# Altium footprint library SOCKET_DIPSMD.PcbLib: 18 footprints (part 1 of 2)
Each footprint in its own frame and in the unit in brackets; x right, y up, seen from the top. Pads: shape width x height; smd on the part's side, far side on the other; paste and mask are expansions set on the pad; w line width, h text height; cw(c..) or ccw(c..) is an arc to the next point about the centre after c.
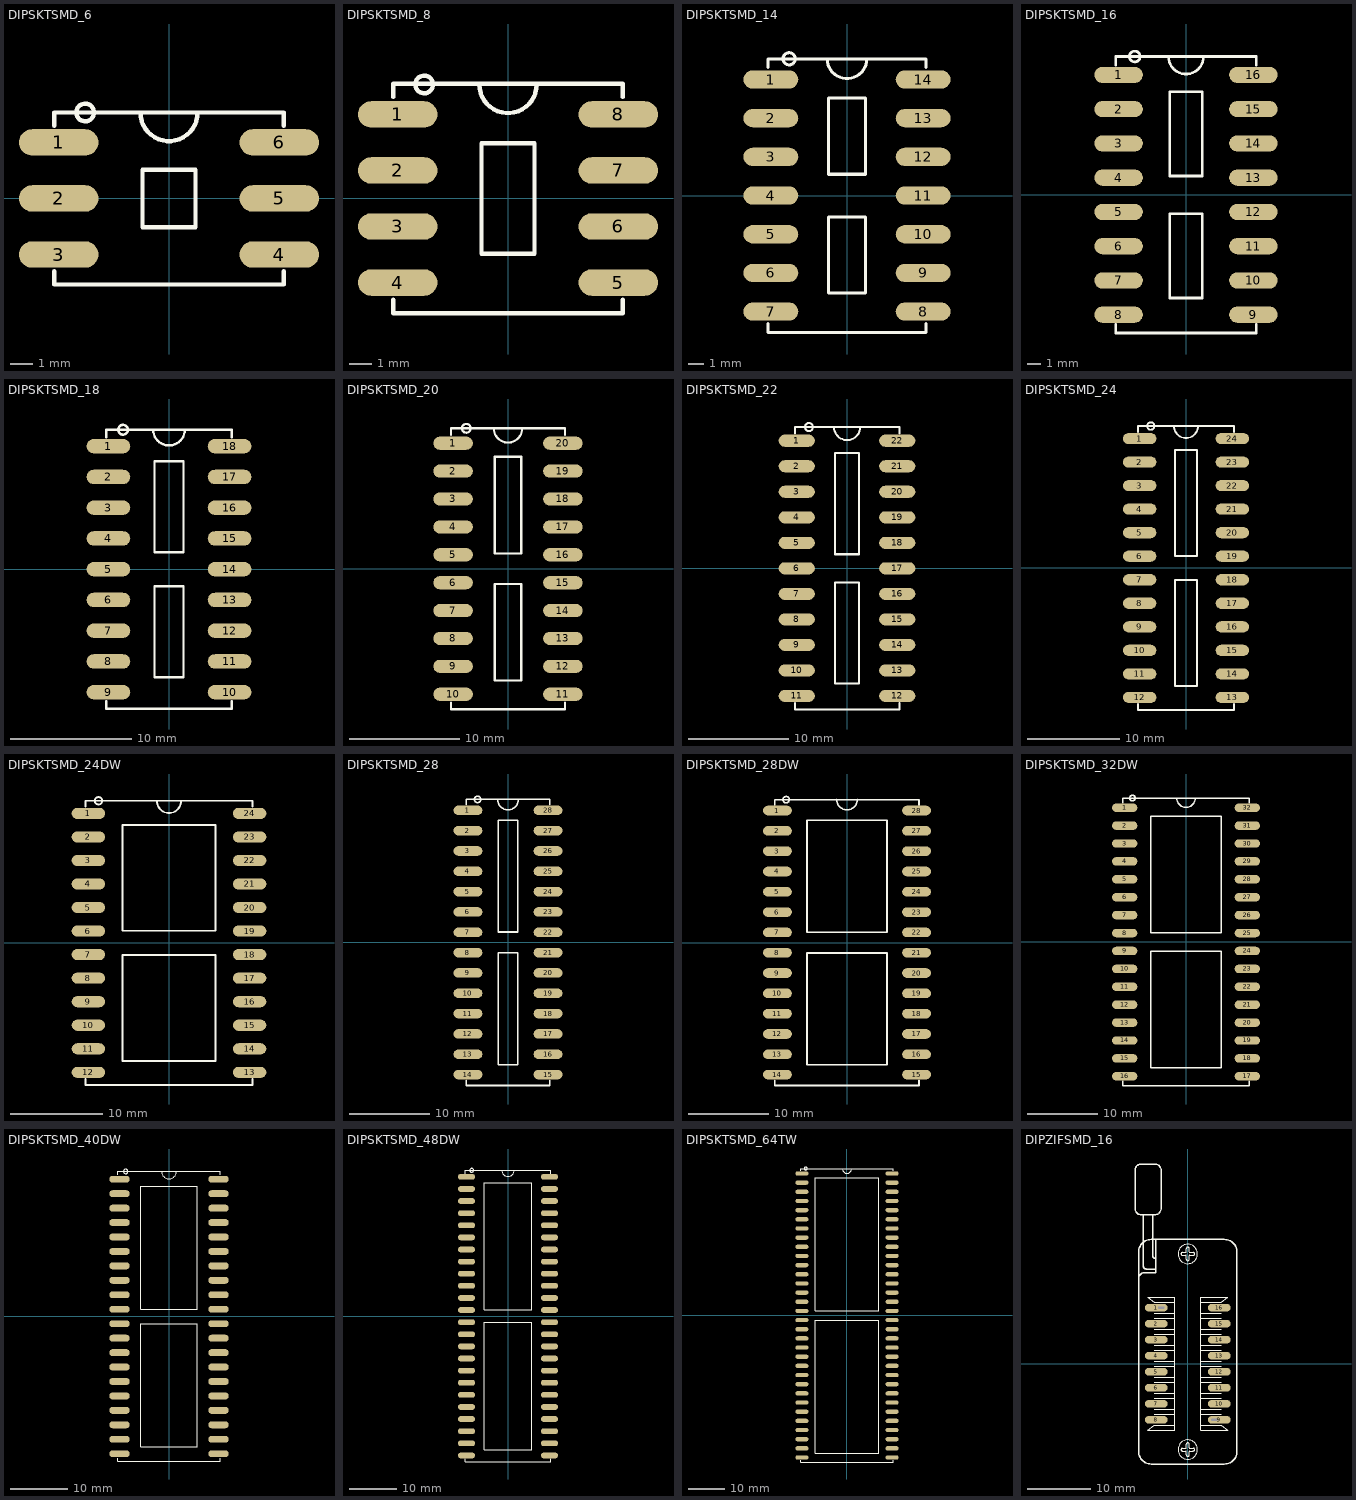
[diagram p0: the footprints below, top view; thin cyan lines are the x and y axes]

## DIPSKTSMD_6 [mm] "SOCKET DIP, pitch 2.54mm, 300mil Width"
pads (6):
  oval 3.6x1.2 smd: 1(-5,2.54) 2(-5,0) 3(-5,-2.54) 4(5,-2.54) 5(5,0) 6(5,2.54)
TopOverlay:
  circle w0.2: c-3.8,3.9 r0.4
  lines w0.2: -5.2,-3.3 -5.2,-3.9 5.2,-3.9 5.2,-3.3 ; -5.2,3.3 -5.2,3.9 5.2,3.9 5.2,3.3 ; -1.3,3.9 ccw(c0,3.9) 1.3,3.9 ; -1.2,-1.3 -1.2,1.3 1.2,1.3 1.2,-1.3 -1.2,-1.3
3D body "User Library-6pin 0_3inch 2_54mm IC DIP-SMD Gold Socket.step": height 5.7, standoff 0.02, extent -6.21,-3.8 6.21,3.82

## DIPSKTSMD_8 [mm] "SOCKET DIP, pitch 2.54mm, 300mil Width"
pads (8):
  oval 3.6x1.2 smd: 1(-5,3.81) 2(-5,1.27) 3(-5,-1.27) 4(-5,-3.81) 5(5,-3.81) 6(5,-1.27) 7(5,1.27) 8(5,3.81)
TopOverlay:
  circle w0.2: c-3.8,5.17 r0.4
  lines w0.2: -5.2,-4.6 -5.2,-5.2 5.2,-5.2 5.2,-4.6 ; -5.2,4.6 -5.2,5.2 5.2,5.2 5.2,4.6 ; -1.3,5.17 ccw(c0,5.17) 1.3,5.17 ; -1.2,-2.5 1.2,-2.5 1.2,2.5 -1.2,2.5 -1.2,-2.5
3D body "User Library-8pin 0_3inch 2_54mm IC DIP-SMD Gold Socket.step": height 5.7, standoff 0.02, extent -6.19,-5.08 6.23,5.08

## DIPSKTSMD_14 [mm] "SOCKET DIP, pitch 2.54mm, 300mil Width"
pads (14):
  oval 3.6x1.2 smd: 1(-5,7.62) 2(-5,5.08) 3(-5,2.54) 4(-5,0) 5(-5,-2.54) 6(-5,-5.08) 7(-5,-7.62) 8(5,-7.62) 9(5,-5.08) 10(5,-2.54) 11(5,0) 12(5,2.54) 13(5,5.08) 14(5,7.62)
TopOverlay:
  circle w0.2: c-3.8,8.98 r0.4
  lines w0.2: -5.2,-8.4 -5.2,-8.98 5.2,-8.98 5.2,-8.4 ; -5.2,8.4 -5.2,8.98 5.2,8.98 5.2,8.4 ; -1.3,8.98 ccw(c0,8.98) 1.3,8.98 ; -1.2,-6.4 -1.2,-1.4 1.2,-1.4 1.2,-6.4 -1.2,-6.4 ; -1.2,1.4 1.2,1.4 1.2,6.4 -1.2,6.4 -1.2,1.4
3D body "User Library-14pin 0_3inch 2_54mm IC DIP-SMD Gold Socket.step": height 5.7, standoff 0.02, extent -6.21,-8.9 6.21,8.88

## DIPSKTSMD_16 [mm] "SOCKET DIP, pitch 2.54mm, 300mil Width"
pads (16):
  oval 3.6x1.2 smd: 1(-5,8.89) 2(-5,6.35) 3(-5,3.81) 4(-5,1.27) 5(-5,-1.27) 6(-5,-3.81) 7(-5,-6.35) 8(-5,-8.89) 9(5,-8.89) 10(5,-6.35) 11(5,-3.81) 12(5,-1.27) 13(5,1.27) 14(5,3.81) 15(5,6.35) 16(5,8.89)
TopOverlay:
  circle w0.2: c-3.8,10.25 r0.4
  lines w0.2: -5.2,-9.6 -5.2,-10.25 5.2,-10.25 5.2,-9.6 ; -5.2,9.6 -5.2,10.25 5.2,10.25 5.2,9.6 ; -1.3,10.25 ccw(c0,10.25) 1.3,10.25 ; -1.2,-7.65 1.2,-7.65 1.2,-1.4 -1.2,-1.4 -1.2,-7.65 ; -1.2,1.4 -1.2,7.65 1.2,7.65 1.2,1.4 -1.2,1.4
3D body "User Library-16pin 0_3inch 2_54mm IC DIP-SMD Socket.step": height 5.7, standoff 0.02, extent -6.19,-10.16 6.23,10.16

## DIPSKTSMD_18 [mm] "SOCKET DIP, pitch 2.54mm, 300mil Width"
pads (18):
  oval 3.6x1.2 smd: 1(-5,10.16) 2(-5,7.62) 3(-5,5.08) 4(-5,2.54) 5(-5,0) 6(-5,-2.54) 7(-5,-5.08) 8(-5,-7.62) 9(-5,-10.16) 10(5,-10.16) 11(5,-7.62) 12(5,-5.08) 13(5,-2.54) 14(5,0) 15(5,2.54) 16(5,5.08) 17(5,7.62) 18(5,10.16)
TopOverlay:
  circle w0.2: c-3.8,11.52 r0.4
  lines w0.2: -5.2,-10.9 -5.2,-11.52 5.2,-11.52 5.2,-10.9 ; -5.2,10.9 -5.2,11.52 5.2,11.52 5.2,10.9 ; -1.3,11.52 ccw(c0,11.52) 1.3,11.52 ; -1.2,-8.92 -1.2,-1.4 1.2,-1.4 1.2,-8.92 -1.2,-8.92 ; -1.2,1.4 1.2,1.4 1.2,8.92 -1.2,8.92 -1.2,1.4
3D body "User Library-18pin 0_3inch 2_54mm IC DIP-SMD Socket.step": height 5.7, standoff 0.02, extent -6.21,-11.4 6.21,11.46

## DIPSKTSMD_20 [mm] "SOCKET DIP, pitch 2.54mm, 300mil Width"
pads (20):
  oval 3.6x1.2 smd: 1(-5,11.43) 2(-5,8.89) 3(-5,6.35) 4(-5,3.81) 5(-5,1.27) 6(-5,-1.27) 7(-5,-3.81) 8(-5,-6.35) 9(-5,-8.89) 10(-5,-11.43) 11(5,-11.43) 12(5,-8.89) 13(5,-6.35) 14(5,-3.81) 15(5,-1.27) 16(5,1.27) 17(5,3.81) 18(5,6.35) 19(5,8.89) 20(5,11.43)
TopOverlay:
  circle w0.2: c-3.8,12.79 r0.4
  lines w0.2: -5.2,-12.2 -5.2,-12.79 5.2,-12.79 5.2,-12.2 ; -5.2,12.2 -5.2,12.79 5.2,12.79 5.2,12.2 ; -1.3,12.79 ccw(c0,12.79) 1.3,12.79 ; -1.2,-10.19 1.2,-10.19 1.2,-1.4 -1.2,-1.4 -1.2,-10.19 ; -1.2,1.4 -1.2,10.19 1.2,10.19 1.2,1.4 -1.2,1.4
3D body "User Library-20pin 0_3inch 2_54mm IC DIP-SMD Socket.step": height 5.7, standoff 0.02, extent -6.21,-12.7 6.21,12.7

## DIPSKTSMD_22 [mm] "SOCKET DIP, pitch 2.54mm, 400mil Width, 28X10mm"
pads (22):
  oval 3.6x1.2 smd: 1(-5,12.7) 2(-5,10.16) 3(-5,7.62) 4(-5,5.08) 5(-5,2.54) 6(-5,0) 7(-5,-2.54) 8(-5,-5.08) 9(-5,-7.62) 10(-5,-10.16) 11(-5,-12.7) 12(5,-12.7) 13(5,-10.16) 14(5,-7.62) 15(5,-5.08) 16(5,-2.54) 17(5,0) 18(5,2.54) 19(5,5.08) 20(5,7.62) 21(5,10.16) 22(5,12.7)
TopOverlay:
  circle w0.2: c-3.79,14.06 r0.4
  lines w0.2: -5.19,-13.4 -5.19,-14.06 5.21,-14.06 5.21,-13.4 ; -5.19,13.4 -5.19,14.06 5.21,14.06 5.21,13.4 ; -1.29,14.06 ccw(c0.01,14.06) 1.31,14.06 ; -1.19,-11.46 1.21,-11.46 1.21,-1.4 -1.19,-1.4 -1.19,-11.46 ; -1.19,1.4 -1.19,11.46 1.21,11.46 1.21,1.4 -1.19,1.4
3D body "User Library-22pin 0_3inch 2_54mm IC DIP-SMD Socket.step": height 5.7, standoff 0.02, extent -6.19,-13.97 6.23,13.97

## DIPSKTSMD_24 [mm] "SOCKET DIP, pitch 2.54mm, 300mil Width"
pads (24):
  oval 3.6x1.2 smd: 1(-5,13.97) 2(-5,11.43) 3(-5,8.89) 4(-5,6.35) 5(-5,3.81) 6(-5,1.27) 7(-5,-1.27) 8(-5,-3.81) 9(-5,-6.35) 10(-5,-8.89) 11(-5,-11.43) 12(-5,-13.97) 13(5,-13.97) 14(5,-11.43) 15(5,-8.89) 16(5,-6.35) 17(5,-3.81) 18(5,-1.27) 19(5,1.27) 20(5,3.81) 21(5,6.35) 22(5,8.89) 23(5,11.43) 24(5,13.97)
TopOverlay:
  circle w0.2: c-3.8,15.33 r0.4
  lines w0.2: -5.2,-14.7 -5.2,-15.33 5.2,-15.33 5.2,-14.7 ; -5.2,14.7 -5.2,15.33 5.2,15.33 5.2,14.7 ; -1.3,15.33 ccw(c0,15.33) 1.3,15.33 ; -1.2,-12.73 -1.2,-1.3 1.2,-1.3 1.2,-12.73 -1.2,-12.73 ; -1.2,1.3 1.2,1.3 1.2,12.73 -1.2,12.73 -1.2,1.3
3D body "User Library-24pin 0_3inch 2_54mm IC DIP-SMD Socket.step": height 5.7, standoff 0.02, extent -6.2,-15.24 6.22,15.24

## DIPSKTSMD_24DW [mm] "SOCKET DIP, pitch 2.54mm, 600mil Width"
pads (24):
  oval 3.6x1.2 smd: 1(-8.7,13.97) 2(-8.7,11.43) 3(-8.7,8.89) 4(-8.7,6.35) 5(-8.7,3.81) 6(-8.7,1.27) 7(-8.7,-1.27) 8(-8.7,-3.81) 9(-8.7,-6.35) 10(-8.7,-8.89) 11(-8.7,-11.43) 12(-8.7,-13.97) 13(8.7,-13.97) 14(8.7,-11.43) 15(8.7,-8.89) 16(8.7,-6.35) 17(8.7,-3.81) 18(8.7,-1.27) 19(8.7,1.27) 20(8.7,3.81) 21(8.7,6.35) 22(8.7,8.89) 23(8.7,11.43) 24(8.7,13.97)
TopOverlay:
  circle w0.2: c-7.61,15.33 r0.4
  lines w0.2: -9.01,-14.7 -9.01,-15.33 9,-15.33 9,-14.7 ; -9.01,14.7 -9.01,15.33 9,15.33 9,14.7 ; -1.3,15.3 ccw(c0,15.3) 1.3,15.3 ; -5,-12.73 -5,-1.3 5,-1.3 5,-12.73 -5,-12.73 ; -5,1.3 5,1.3 5,12.73 -5,12.73 -5,1.3
3D body "User Library-24pin 0_6inch 2_54mm IC DIP-SMD Socket.step": height 5.7, standoff 0.02, extent -10.02,-15.2 10.02,15.28

## DIPSKTSMD_28 [mm] "SOCKET DIP, pitch 2.54mm, 300mil Width"
pads (28):
  oval 3.6x1.2 smd: 1(-5,16.51) 2(-5,13.97) 3(-5,11.43) 4(-5,8.89) 5(-5,6.35) 6(-5,3.81) 7(-5,1.27) 8(-5,-1.27) 9(-5,-3.81) 10(-5,-6.35) 11(-5,-8.89) 12(-5,-11.43) 13(-5,-13.97) 14(-5,-16.51) 15(5,-16.51) 16(5,-13.97) 17(5,-11.43) 18(5,-8.89) 19(5,-6.35) 20(5,-3.81) 21(5,-1.27) 22(5,1.27) 23(5,3.81) 24(5,6.35) 25(5,8.89) 26(5,11.43) 27(5,13.97) 28(5,16.51)
TopOverlay:
  circle w0.2: c-3.8,17.87 r0.4
  lines w0.2: -5.2,-17.2 -5.2,-17.87 5.2,-17.87 5.2,-17.2 ; -5.2,17.2 -5.2,17.87 5.2,17.87 5.2,17.2 ; -1.3,17.87 ccw(c0,17.87) 1.3,17.87 ; -1.2,-15.27 1.2,-15.27 1.2,-1.3 -1.2,-1.3 -1.2,-15.27 ; -1.2,1.3 -1.2,15.27 1.2,15.27 1.2,1.3 -1.2,1.3
3D body "User Library-28pin 0_3inch 2_54mm IC DIP-SMD Gold Socket.step": height 5.7, standoff 0.02, extent -6.19,-17.78 6.23,17.78

## DIPSKTSMD_28DW [mm] "SOCKET DIP, pitch 2.54mm, 600mil Width"
pads (28):
  oval 3.6x1.2 smd: 1(-8.7,16.51) 2(-8.7,13.97) 3(-8.7,11.43) 4(-8.7,8.89) 5(-8.7,6.35) 6(-8.7,3.81) 7(-8.7,1.27) 8(-8.7,-1.27) 9(-8.7,-3.81) 10(-8.7,-6.35) 11(-8.7,-8.89) 12(-8.7,-11.43) 13(-8.7,-13.97) 14(-8.7,-16.51) 15(8.7,-16.51) 16(8.7,-13.97) 17(8.7,-11.43) 18(8.7,-8.89) 19(8.7,-6.35) 20(8.7,-3.81) 21(8.7,-1.27) 22(8.7,1.27) 23(8.7,3.81) 24(8.7,6.35) 25(8.7,8.89) 26(8.7,11.43) 27(8.7,13.97) 28(8.7,16.51)
TopOverlay:
  circle w0.2: c-7.61,17.87 r0.4
  lines w0.2: -9.01,-17.2 -9.01,-17.87 9,-17.87 9,-17.2 ; -9.01,17.2 -9.01,17.87 9,17.87 9,17.2 ; -1.3,17.9 ccw(c0,17.9) 1.3,17.9 ; -5,-15.27 -5,-1.3 5,-1.3 5,-15.27 -5,-15.27 ; -5,1.3 5,1.3 5,15.27 -5,15.27 -5,1.3
3D body "User Library-28pin 0_6inch 2_54mm IC DIP-SMD Socket.step": height 5.7, standoff 0.02, extent -10.13,-17.78 9.91,17.78

## DIPSKTSMD_32DW [mm] "SOCKET DIP, pitch 2.54mm, 600mil Width"
pads (32):
  oval 3.6x1.2 smd: 1(-8.7,19.05) 2(-8.7,16.51) 3(-8.7,13.97) 4(-8.7,11.43) 5(-8.7,8.89) 6(-8.7,6.35) 7(-8.7,3.81) 8(-8.7,1.27) 9(-8.7,-1.27) 10(-8.7,-3.81) 11(-8.7,-6.35) 12(-8.7,-8.89) 13(-8.7,-11.43) 14(-8.7,-13.97) 15(-8.7,-16.51) 16(-8.7,-19.05) 17(8.7,-19.05) 18(8.7,-16.51) 19(8.7,-13.97) 20(8.7,-11.43) 21(8.7,-8.89) 22(8.7,-6.35) 23(8.7,-3.81) 24(8.7,-1.27) 25(8.7,1.27) 26(8.7,3.81) 27(8.7,6.35) 28(8.7,8.89) 29(8.7,11.43) 30(8.7,13.97) 31(8.7,16.51) 32(8.7,19.05)
TopOverlay:
  circle w0.2: c-7.61,20.41 r0.4
  lines w0.2: -9,-19.7 -9,-20.41 9,-20.41 9,-19.7 ; -9,19.7 -9,20.41 9,20.41 9,19.7 ; -1.3,20.4 ccw(c0,20.4) 1.3,20.4 ; -5,-17.81 -5,-1.3 5,-1.3 5,-17.81 -5,-17.81 ; -5,1.3 5,1.3 5,17.81 -5,17.81 -5,1.3
3D body "User Library-32pin 0_6inch 2_54mm IC DIP-SMD Socket.step": height 5.7, standoff 0.02, extent -10.02,-20.3 10.02,20.34

## DIPSKTSMD_40DW [mm] "SOCKET DIP, pitch 2.54mm, 600mil Width"
pads (40):
  oval 3.6x1.2 smd: 1(-8.7,24.13) 2(-8.7,21.59) 3(-8.7,19.05) 4(-8.7,16.51) 5(-8.7,13.97) 6(-8.7,11.43) 7(-8.7,8.89) 8(-8.7,6.35) 9(-8.7,3.81) 10(-8.7,1.27) 11(-8.7,-1.27) 12(-8.7,-3.81) 13(-8.7,-6.35) 14(-8.7,-8.89) 15(-8.7,-11.43) 16(-8.7,-13.97) 17(-8.7,-16.51) 18(-8.7,-19.05) 19(-8.7,-21.59) 20(-8.7,-24.13) 21(8.7,-24.13) 22(8.7,-21.59) 23(8.7,-19.05) 24(8.7,-16.51) 25(8.7,-13.97) 26(8.7,-11.43) 27(8.7,-8.89) 28(8.7,-6.35) 29(8.7,-3.81) 30(8.7,-1.27) 31(8.7,1.27) 32(8.7,3.81) 33(8.7,6.35) 34(8.7,8.89) 35(8.7,11.43) 36(8.7,13.97) 37(8.7,16.51) 38(8.7,19.05) 39(8.7,21.59) 40(8.7,24.13)
TopOverlay:
  circle w0.2: c-7.61,25.49 r0.4
  lines w0.2: -9.01,-24.9 -9.01,-25.49 9,-25.49 9,-24.9 ; -9.01,24.9 -9.01,25.49 9,25.49 9,24.9 ; -1.3,25.5 ccw(c0,25.5) 1.3,25.5 ; -5,-22.89 5,-22.89 5,-1.3 -5,-1.3 -5,-22.89 ; -5,1.3 -5,22.89 5,22.89 5,1.3 -5,1.3
3D body "User Library-40pin 0_6inch 2_54mm IC DIP-SMD Socket.step": height 5.7, standoff 0.02, extent -10.03,-25.4 10.01,25.4

## DIPSKTSMD_48DW [mm] "SOCKET DIP, pitch 2.54mm, 600mil Width"
pads (48):
  oval 3.6x1.2 smd: 1(-8.7,29.21) 2(-8.7,26.67) 3(-8.7,24.13) 4(-8.7,21.59) 5(-8.7,19.05) 6(-8.7,16.51) 7(-8.7,13.97) 8(-8.7,11.43) 9(-8.7,8.89) 10(-8.7,6.35) 11(-8.7,3.81) 12(-8.7,1.27) 13(-8.7,-1.27) 14(-8.7,-3.81) 15(-8.7,-6.35) 16(-8.7,-8.89) 17(-8.7,-11.43) 18(-8.7,-13.97) 19(-8.7,-16.51) 20(-8.7,-19.05) 21(-8.7,-21.59) 22(-8.7,-24.13) 23(-8.7,-26.67) 24(-8.7,-29.21) 25(8.7,-29.21) 26(8.7,-26.67) 27(8.7,-24.13) 28(8.7,-21.59) 29(8.7,-19.05) 30(8.7,-16.51) 31(8.7,-13.97) 32(8.7,-11.43) 33(8.7,-8.89) 34(8.7,-6.35) 35(8.7,-3.81) 36(8.7,-1.27) 37(8.7,1.27) 38(8.7,3.81) 39(8.7,6.35) 40(8.7,8.89) 41(8.7,11.43) 42(8.7,13.97) 43(8.7,16.51) 44(8.7,19.05) 45(8.7,21.59) 46(8.7,24.13) 47(8.7,26.67) 48(8.7,29.21)
TopOverlay:
  circle w0.2: c-7.61,30.57 r0.4
  lines w0.2: -9.01,-29.9 -9.01,-30.57 9,-30.57 9,-29.9 ; -9.01,29.9 -9.01,30.57 9,30.57 9,29.9 ; -1.3,30.6 ccw(c0,30.6) 1.3,30.6 ; -5,-27.97 5,-27.97 5,-1.3 -5,-1.3 -5,-27.97 ; -5,1.3 -5,27.97 5,27.97 5,1.3 -5,1.3
3D body "User Library-48pin 0_6inch 2_54mm IC DIP-SMD Socket.step": height 5.7, standoff 0.02, extent -10.01,-30.48 10.03,30.48

## DIPSKTSMD_64TW [mm] "SOCKET DIP, pitch 2.54mm, 900mil Width"
pads (64):
  oval 3.6x1.2 smd: 1(-12.5,39.37) 2(-12.5,36.83) 3(-12.5,34.29) 4(-12.5,31.75) 5(-12.5,29.21) 6(-12.5,26.67) 7(-12.5,24.13) 8(-12.5,21.59) 9(-12.5,19.05) 10(-12.5,16.51) 11(-12.5,13.97) 12(-12.5,11.43) 13(-12.5,8.89) 14(-12.5,6.35) 15(-12.5,3.81) 16(-12.5,1.27) 17(-12.5,-1.27) 18(-12.5,-3.81) 19(-12.5,-6.35) 20(-12.5,-8.89) 21(-12.5,-11.43) 22(-12.5,-13.97) 23(-12.5,-16.51) 24(-12.5,-19.05) 25(-12.5,-21.59) 26(-12.5,-24.13) 27(-12.5,-26.67) 28(-12.5,-29.21) 29(-12.5,-31.75) 30(-12.5,-34.29) 31(-12.5,-36.83) 32(-12.5,-39.37) 33(12.5,-39.37) 34(12.5,-36.83) 35(12.5,-34.29) 36(12.5,-31.75) 37(12.5,-29.21) 38(12.5,-26.67) 39(12.5,-24.13) 40(12.5,-21.59) 41(12.5,-19.05) 42(12.5,-16.51) 43(12.5,-13.97) 44(12.5,-11.43) 45(12.5,-8.89) 46(12.5,-6.35) 47(12.5,-3.81) 48(12.5,-1.27) 49(12.5,1.27) 50(12.5,3.81) 51(12.5,6.35) 52(12.5,8.89) 53(12.5,11.43) 54(12.5,13.97) 55(12.5,16.51) 56(12.5,19.05) 57(12.5,21.59) 58(12.5,24.13) 59(12.5,26.67) 60(12.5,29.21) 61(12.5,31.75) 62(12.5,34.29) 63(12.5,36.83) 64(12.5,39.37)
TopOverlay:
  circle w0.2: c-11.42,40.73 r0.4
  lines w0.2: -12.82,-40.1 -12.82,-40.73 12.8,-40.73 12.8,-40.1 ; -12.82,40.1 -12.82,40.73 12.8,40.73 12.8,40.1 ; -1.3,40.7 ccw(c0,40.7) 1.3,40.7 ; -8.8,-38.13 8.8,-38.13 8.8,-1.3 -8.8,-1.3 -8.8,-38.13 ; -8.8,1.3 -8.8,38.13 8.8,38.13 8.8,1.3 -8.8,1.3
3D body "User Library-64pin 0_9inch 2_54mm IC DIP-SMD Gold Socket.step": height 5.7, standoff 0.02, extent -13.83,-40.64 13.83,40.64

## DIPZIFSMD_16 [mm] "SOCKET ZIF DIP, pitch 2.54mm, 300mil Width"
pads (18):
  oval 3.6x1.2 smd: 1(-5,8.89) 2(-5,6.35) 3(-5,3.81) 4(-5,1.27) 5(-5,-1.27) 6(-5,-3.81) 7(-5,-6.35) 8(-5,-8.89) 9(5,-8.89) 10(5,-6.35) 11(5,-3.81) 12(5,-1.27) 13(5,1.27) 14(5,3.81) 15(5,6.35) 16(5,8.89)
  oval 1.2x0.5 / inner round 0 / far side round 0 hole 0.3 slot 1 at 0 deg: 1(-4.2,8.89) 9(4.2,-8.89)
TopOverlay:
  circle w0.102: c0,-13.61 r1.53
  circle w0.102: c0,17.41 r1.53
  lines w0.102: -5.334,-8.001 -2.032,-8.001 ; -5.334,-7.239 -2.032,-7.239 ; -5.334,-5.461 -2.032,-5.461 ; -5.334,-4.699 -2.032,-4.699 ; -5.334,-2.921 -2.032,-2.921 ; -5.334,-2.159 -2.032,-2.159 ; -5.334,-0.381 -2.032,-0.381 ; -5.334,0.381 -2.032,0.381 ; -5.334,2.159 -2.032,2.159 ; -5.334,2.921 -2.032,2.921 ; -5.334,4.699 -2.032,4.699 ; -5.334,5.461 -2.032,5.461 ; -5.334,7.239 -2.032,7.239 ; -5.334,8.001 -2.032,8.001 ; -2.032,-9.779 -5.334,-9.779 -6.35,-10.541 -2.032,-10.541 -2.032,10.541 -6.35,10.541 -5.334,9.779 -2.032,9.779 ; -0.85,17.18 cw(c-0.85,17.41) -1.08,17.41 cw(c-0.85,17.41) -0.85,17.64 -0.31,17.64 ; -0.85,17.18 -0.3,17.18 ; -0.31,-13.84 -0.85,-13.84 cw(c-0.85,-13.61) -1.08,-13.61 cw(c-0.85,-13.61) -0.85,-13.38 -0.3,-13.38 ; -0.3,-13.84 cw(c-0.3,-13.91) -0.23,-13.91 -0.23,-14.46 ccw(c0,-14.46) 0,-14.69 ccw(c0,-14.46) 0.23,-14.46 0.23,-13.92 ; -0.3,-13.37 ccw(c-0.3,-13.3) -0.23,-13.3 -0.23,-12.76 cw(c0,-12.76) 0,-12.53 cw(c0,-12.76) 0.23,-12.76 0.23,-13.31 ccw(c0.3,-13.31) 0.3,-13.38 ; -0.3,17.17 cw(c-0.3,17.1) -0.23,17.1 -0.23,16.56 ccw(c0,16.56) 0,16.33 ccw(c0,16.56) 0.23,16.56 0.23,17.11 cw(c0.3,17.11) 0.3,17.18 ; -0.3,17.64 ccw(c-0.3,17.71) -0.23,17.71 -0.23,18.26 cw(c0,18.26) 0,18.49 cw(c0,18.26) 0.23,18.26 0.23,17.72 ; 0.23,-13.91 cw(c0.3,-13.91) 0.3,-13.84 ; 0.23,17.71 ccw(c0.3,17.71) 0.3,17.64 0.85,17.64 cw(c0.85,17.41) 1.08,17.41 cw(c0.85,17.41) 0.85,17.18 ; 0.3,-13.84 0.85,-13.84 ccw(c0.85,-13.61) 1.08,-13.61 ccw(c0.85,-13.61) 0.85,-13.38 0.31,-13.38 ; 0.31,17.18 0.85,17.18 ; 2.032,-9.779 5.334,-9.779 6.35,-10.541 2.032,-10.541 2.032,10.541 6.35,10.541 5.334,9.779 2.032,9.779 ; 2.032,-8.001 5.334,-8.001 ; 2.032,-7.239 5.334,-7.239 ; 2.032,-5.461 5.334,-5.461 ; 2.032,-4.699 5.334,-4.699 ; 2.032,-2.921 5.334,-2.921 ; 2.032,-2.159 5.334,-2.159 ; 2.032,-0.381 5.334,-0.381 ; 2.032,0.381 5.334,0.381 ; 2.032,2.159 5.334,2.159 ; 2.032,2.921 5.334,2.921 ; 2.032,4.699 5.334,4.699 ; 2.032,5.461 5.334,5.461 ; 2.032,7.239 5.334,7.239 ; 2.032,8.001 5.334,8.001
  lines w0.2: -7.8,13.4 cw(c-6.8,13.449) -6.8,14.45 -5.1,14.45 -5.1,19.7 ; -7.1,23.57 -7.1,15.6 ccw(c-6.5,15.6) -6.5,15 -5.1,15 ; -5.55,23.57 -5.55,17.1 ccw(c-5.15,17.1) -5.15,16.7 ; -8.37,24.62 ccw(c-7.37,24.62) -7.37,23.62 -5.23,23.62 ccw(c-5.23,24.62) -4.23,24.62 -4.23,30.67 ccw(c-5.23,30.67) -5.23,31.67 -7.37,31.67 ccw(c-7.37,30.67) -8.37,30.67 -8.37,24.62 ; -7.8,-13.9 ccw(c-5.8,-13.9) -5.8,-15.9 5.8,-15.9 ccw(c5.8,-13.9) 7.8,-13.9 7.8,17.7 ccw(c5.8,17.7) 5.8,19.7 -5.8,19.7 ccw(c-5.8,17.7) -7.8,17.7 -7.8,-13.9
3D body "User Library-16 pin IC ZIF Socket closed.STEP": height 15.1, standoff 0, extent -8.4,-15.828 7.65,32.035